# Altium footprint library Test_Stand_Pergam.PcbLib: 34 footprints (part 2 of 3)
Each footprint in its own frame and in the unit in brackets; x right, y up, seen from the top. Pads: shape width x height; smd on the part's side, far side on the other; paste and mask are expansions set on the pad; w line width, h text height; cw(c..) or ccw(c..) is an arc to the next point about the centre after c.
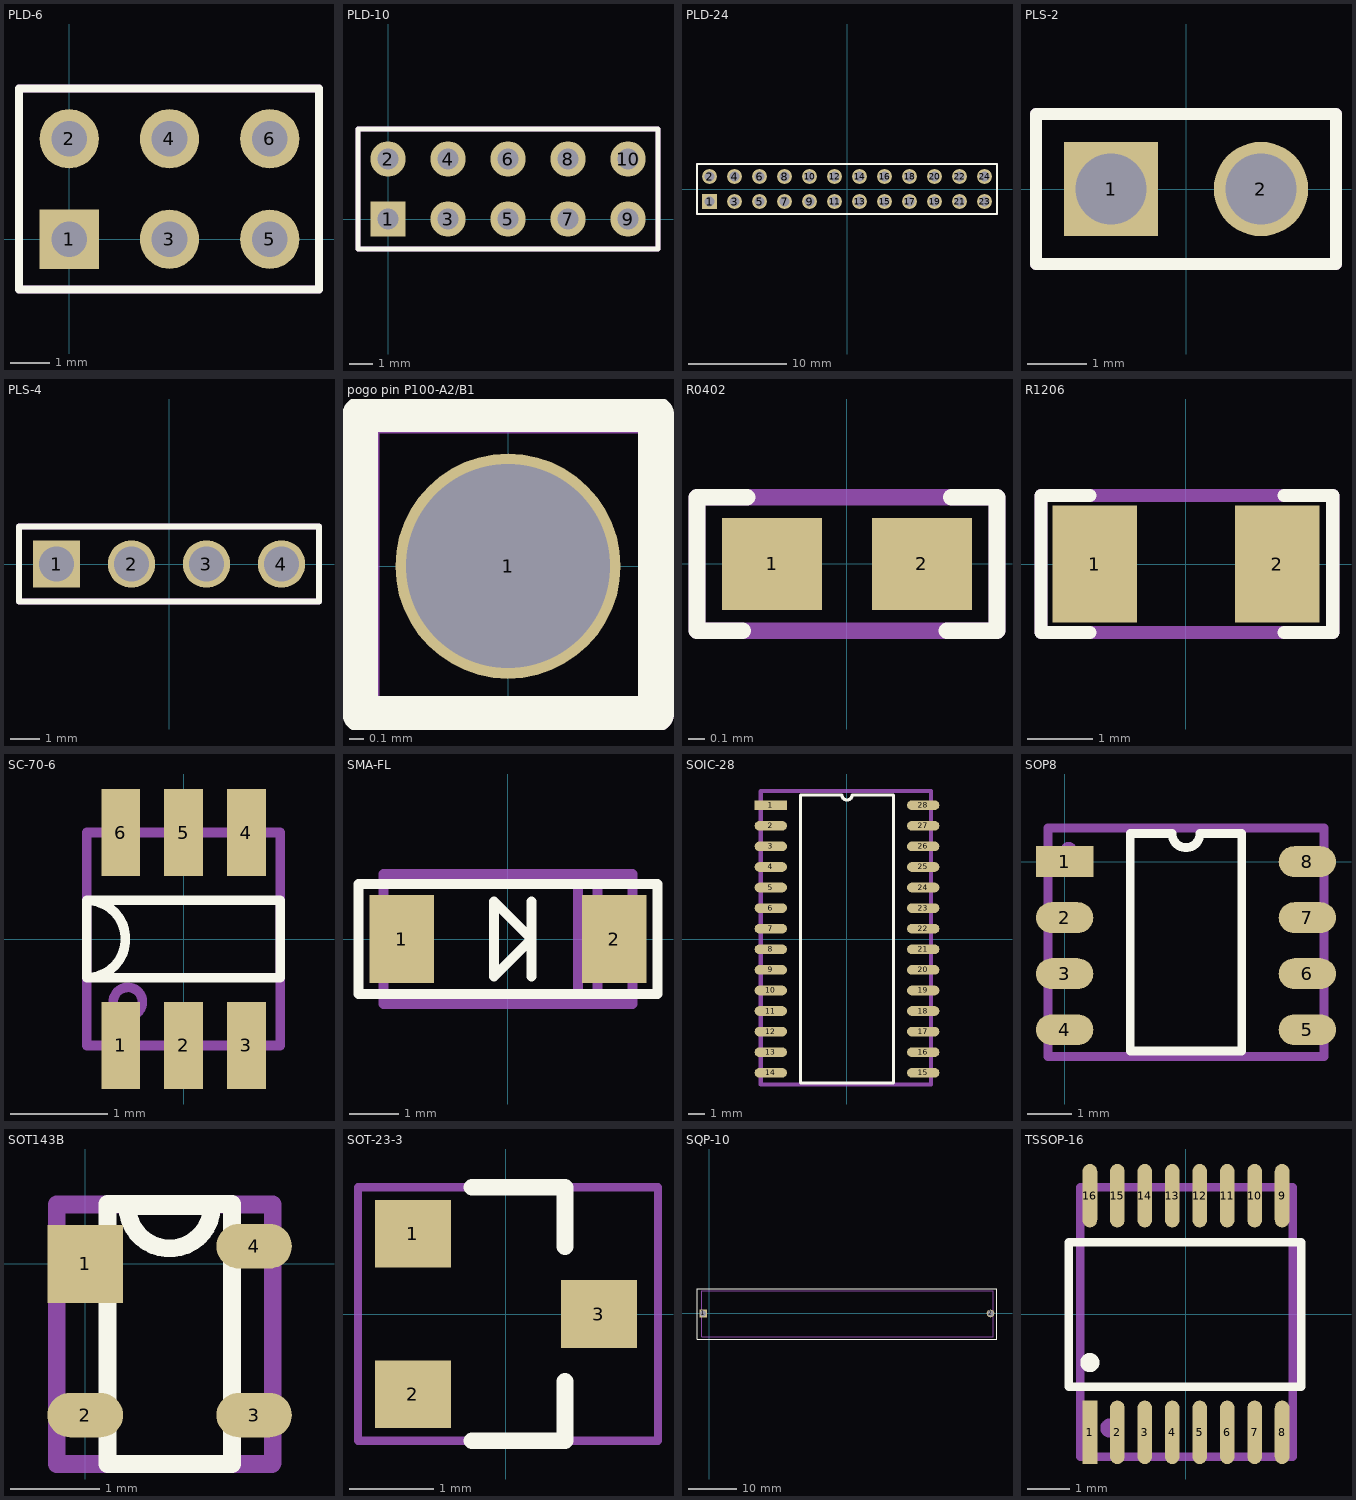
[diagram p1: the footprints below, top view; thin cyan lines are the x and y axes]

## PLD-6 [mm]
height 8.5
pads (6):
  rect 1.5x1.5 hole 0.9: 1(0,0)
  round 1.5 hole 0.9: 2(0,2.54) 3(2.54,0) 4(2.54,2.54) 5(5.08,0) 6(5.08,2.54)
Top Overlay:
  lines w0.2: -1.27,-1.27 -1.27,3.81 6.325,3.81 6.325,-1.27 -1.27,-1.27
Mechanical 29:
  circle w0.254: c0,0 r0.141
  lines w0.2: -1.27,-1.27 -1.27,3.81 6.325,3.81 6.325,-1.27 -1.27,-1.27
  text "'.Designator'" at 1.425,1.175 h0.39
3D body "User Library-2x3 TH Pitch 2_54mm.STEP": height 9.2, standoff -3.5, extent -1.275,-1.275 6.345,3.805

## PLD-10 [mm]
height 8.5
pads (10):
  rect 1.5x1.5 hole 0.9: 1(0,0)
  round 1.5 hole 0.9: 2(0,2.54) 3(2.54,0) 4(2.54,2.54) 5(5.08,0) 6(5.08,2.54) 7(7.62,0) 8(7.62,2.54) 9(10.16,0) 10(10.16,2.54)
Top Overlay:
  lines w0.2: -1.27,-1.27 11.43,-1.27 11.43,3.81 -1.27,3.81 -1.27,-1.27
Mechanical 29:
  circle w0.254: c0,0 r0.141
  lines w0.2: -1.27,-1.27 11.43,-1.27 11.43,3.81 -1.27,3.81 -1.27,-1.27
  text "'.Designator'" at 2,1 h1
3D body "User Library-PLD10.STEP": height 8.54, standoff -3, extent -1.27,-1.265 11.43,3.815

## PLD-24 [mm]
height 8.5
pads (24):
  rect 1.5x1.5 hole 1: 1(-13.97,-1.27)
  round 1.5 hole 1: 2(-13.97,1.27) 3(-11.43,-1.27) 4(-11.43,1.27) 5(-8.89,-1.27) 6(-8.89,1.27) 7(-6.35,-1.27) 8(-6.35,1.27) 9(-3.81,-1.27) 10(-3.81,1.27) 11(-1.27,-1.27) 12(-1.27,1.27) 13(1.27,-1.27) 14(1.27,1.27) 15(3.81,-1.27) 16(3.81,1.27) 17(6.35,-1.27) 18(6.35,1.27) 19(8.89,-1.27) 20(8.89,1.27) 21(11.43,-1.27) 22(11.43,1.27) 23(13.97,-1.27) 24(13.97,1.27)
Top Overlay:
  lines w0.2: -15.24,-2.54 -15.24,2.54 15.24,2.54 15.24,-2.54 -15.24,-2.54
Mechanical 29:
  circle w0.254: c-14.111,-1.27 r0.141
  lines w0.2: -15.24,-2.54 -15.24,2.54 15.24,2.54 15.24,-2.54 -15.24,-2.54
  text "'.Designator'" at -0.25,0 h0.39
3D body "User Library-DS1021-1x6S61.step": height 8.6, standoff -3, extent -15.24,-2.54 0,0
3D body "User Library-DS1021-1x6S61.step": height 8.6, standoff -3, extent 0,-2.54 15.24,0
3D body "User Library-DS1021-1x6S61.step": height 8.6, standoff -3, extent 0,0 15.24,2.54
3D body "User Library-DS1021-1x6S61.step": height 8.6, standoff -3, extent -15.24,0 0,2.54

## PLS-2 [mm]
pads (2):
  rect 1.6x1.6 hole 1.2: 1(-1.27,0)
  round 1.6 hole 1.2: 2(1.27,0)
Top Overlay:
  lines w0.2: -2.54,-1.27 2.54,-1.27 2.54,1.27 -2.54,1.27 -2.54,-1.27
Mechanical 29:
  lines w0.2: -2.54,-1.27 2.54,-1.27 2.54,1.27 -2.54,1.27 -2.54,-1.27
  text "'.Designator'" at -1.905,-0.425 h1
3D body "User Library-PLS2.STEP": height 8.54, standoff -3, extent -2.54,-1.27 2.54,1.27

## PLS-4 [mm]
pads (4):
  rect 1.6x1.6 hole 1.2: 1(-3.81,0)
  round 1.6 hole 1.2: 2(-1.27,0) 3(1.27,0) 4(3.81,0)
Top Overlay:
  lines w0.2: -5.08,-1.27 5.08,-1.27 5.08,1.27 -5.08,1.27 -5.08,-1.27
Mechanical 29:
  lines w0.2: -5.08,-1.27 -5.08,1.27 ; -5.08,-1.27 5.08,-1.27 ; -5.08,-1.27 -5.08,1.27 ; -5.08,-1.27 5.08,-1.27 ; -5.08,1.27 5.08,1.27 ; -5.08,1.27 5.08,1.27 ; 5.08,-1.27 5.08,1.27 ; 5.08,-1.27 5.08,1.27
  text "'.Designator'" at -1.8,-0.5 h1
3D body "User Library-1x4 TH Pitch 2_54mm.STEP": height 9.2, standoff -3.5, extent -5.08,-1.27 5.08,1.27

## pogo pin P100-A2/B1 [mm]
pads (1):
  round 1.6 hole 1.45: 1(0,0)
Top Overlay:
  lines w0.254: -1.05,-1.05 -1.05,1.08 1.05,1.08 1.05,-1.05 -1.05,-1.05
Mechanical 29:
  lines w0.254: -1.04,-1.05 1.05,-1.05 1.05,1.07 -1.04,1.07 -1.04,-1.05
  text "'.Designator'" at 0.1,0.267 h0.5
3D body: height 33.35, standoff 0, extent -0.694,-0.698 0.7,0.699

## R0402 [mm] "Resistor 0402"
height 0.35
pads (2):
  rect 0.6x0.55 smd: 1(-0.45,0) 2(0.45,0)
Top Overlay:
  lines w0.1: -0.625,-0.4 -0.9,-0.4 -0.9,0.4 -0.6,0.4 ; 0.6,-0.4 0.9,-0.4 0.9,0.4 0.625,0.4
Mechanical 29:
  lines w0.1: -0.9,-0.4 0.9,-0.4 0.9,0.4 -0.9,0.4 -0.9,-0.4
  text "'.Designator'" at -0.7,-0.2 h0.39
3D body "User Library-User Library-0402_Res1.STEP": height 0.51, standoff 0, extent -0.73,-0.25 0.73,0.25

## R1206 [mm]
pads (2):
  rect 1.3x1.8 smd: 1(-1.4,0) 2(1.4,0)
Top Overlay:
  lines w0.2: -1.475,-1.05 -2.225,-1.05 -2.225,1.05 -1.475,1.05 ; 1.5,-1.05 2.25,-1.05 2.25,1.05 1.5,1.05
Mechanical 29:
  lines w0.2: -2.225,-1.05 -2.225,1.05 2.25,1.05 2.25,-1.05 -2.225,-1.05
  text "'.Designator'" at -1.8,-0.5 h1
3D body "User Library-User Library-1206_Res1.STEP": height 1.25, standoff 0, extent -2.27,-0.8 2.27,0.8

## SC-70-6 [mm]
pads (6):
  rect 0.4x0.9 smd: 1(-0.65,-1.1) 2(0,-1.1) 3(0.65,-1.1) 4(0.65,1.1) 5(0,1.1) 6(-0.65,1.1)
Top Overlay:
  lines w0.1: -1,-0.4 ccw(c-1,0) -1,0.4 ; -1,-0.4 1,-0.4 1,0.4 -1,0.4 ; -1,-0.4 -1,0.4
Mechanical 29:
  circle w0.1: c-0.575,-0.65 r0.15
  lines w0.1: -1,-1.1 -1,1.1 1,1.1 1,-1.1 -1,-1.1
  text "'.Designator'" at -1.225,-0.15 h0.52
3D body "SC70-6.step": height 0.92, standoff -0.03, extent -1,-1.05 1,1.05

## SMA-FL [mm]
height 1.1
pads (2):
  rect 1.3x1.76 smd: 1(-2.13,0) 2(2.13,0)
Top Overlay:
  lines w0.2: 0.47,-0.75 0.47,0.75 ; -3,-1.1 -3,1.1 3,1.1 3,-1.1 -3,-1.1 ; -0.28,-0.75 -0.28,0.75 0.47,0 -0.28,-0.75
Mechanical 29:
  lines w0.2: 1.4,-1.3 1.4,1.3 ; 1.8,-1.3 1.8,1.3 ; -2.5,-1.3 2.5,-1.3 2.5,1.3 -2.5,1.3 -2.5,-1.3
  text "'.Designator'" at -2.2,0 h0.39
3D body "User Library-sma-fl.STEP": height 1.2, standoff 0, extent -2.55,-1.3 2.55,1.3

## SOIC-28 [mm]
pads (28):
  rect 2x0.6 smd: 1(-4.7,8.255)
  oval 2x0.6 smd: 2(-4.7,6.985) 3(-4.7,5.715) 4(-4.7,4.445) 5(-4.7,3.175) 6(-4.7,1.905) 7(-4.7,0.635) 8(-4.7,-0.635) 9(-4.7,-1.905) 10(-4.7,-3.175) 11(-4.7,-4.445) 12(-4.7,-5.715) 13(-4.7,-6.985) 14(-4.7,-8.255) 15(4.7,-8.255) 16(4.7,-6.985) 17(4.7,-5.715) 18(4.7,-4.445) 19(4.7,-3.175) 20(4.7,-1.905) 21(4.7,-0.635) 22(4.7,0.635) 23(4.7,1.905) 24(4.7,3.175) 25(4.7,4.445) 26(4.7,5.715) 27(4.7,6.985) 28(4.7,8.255)
Top Overlay:
  lines w0.2: -2.865,-8.89 -2.865,8.89 -0.318,8.89 ccw(c0,8.89) 0.318,8.89 2.865,8.89 2.865,-8.89 -2.865,-8.89
Mechanical 29:
  lines w0.254: -5.32,-8.985 -5.32,9.115 -5.31,9.125 5.18,9.125 5.18,8.945 5.18,-8.985 -5.32,-8.985
  text "'.Designator'" at -3.99,-0.237 h0.7
3D body "User Library-SOIC-28-300.STEP": height 2.61, standoff 0.01, extent -5.325,-9.07 5.275,9.03

## SOP8 [mm]
pads (8):
  rect 1.3x0.7 smd: 1(0,0)
  oval 1.3x0.7 smd: 2(0,-1.27) 3(0,-2.54) 4(0,-3.81) 5(5.5,-3.81) 6(5.5,-2.54) 7(5.5,-1.27) 8(5.5,0)
Top Overlay:
  lines w0.2: 1.485,-4.29 1.485,0.635 2.432,0.635 ccw(c2.75,0.635) 3.067,0.635 4.015,0.635 4.015,-4.29 1.485,-4.29
Mechanical 29:
  circle w0.254: c0.09,0.265 r0.054
  lines w0.2: -0.38,-4.415 5.88,-4.415 5.88,0.765 -0.38,0.765 -0.38,-4.415
  text "'.Designator'" at 2.03,-1.647 h0.7
3D body "User Library-sop8_model.STEP": height 1.57, standoff 0.01, extent -0.24,-4.275 5.74,0.625

## SOT143B [mm]
pads (4):
  rect 0.85x0.88 smd: 1(0,0)
  oval 0.85x0.5 smd: 2(0,-1.7) 3(1.9,-1.7) 4(1.9,0.2)
Top Overlay:
  lines w0.2: 0.469,0.65 1.394,0.65 ; 0.475,0.65 ccw(c0.95,0.65) 1.425,0.65 ; 0.25,-2.25 1.65,-2.25 1.65,0.675 0.25,0.675 0.25,-2.25
Mechanical 29:
  lines w0.2: -0.32,-2.25 -0.32,0.67 2.11,0.67 2.11,-2.24 2.1,-2.25 -0.32,-2.25
  text "'.Designator'" at -0.1,-0.997 h0.7
3D body "User Library-sot143.STEP": height 1, standoff 0, extent -0.31,-2.245 2.11,0.675

## SOT-23-3 [mm]
height 1
pads (3):
  rect 0.9x0.8 smd: 1(-1.1,0.95) 2(-1.1,-0.95) 3(1.1,0)
Top Overlay:
  lines w0.2: -0.4,-1.5 0.7,-1.5 0.7,-0.8 ; -0.4,1.5 0.7,1.5 0.7,0.8
Mechanical 29:
  lines w0.1: -1.75,-1.5 -1.75,1.5 1.8,1.5 1.8,-1.5 -1.75,-1.5
  text "'.Designator'" at -0.35,1.275 h0.7
3D body "SOT-23-3.step": height 1.3, standoff 0, extent -1.4,-1.45 1.4,1.45

## SQP-10 [mm]
pads (2):
  rect 1.6x1.6 hole 1.2: 1(-1.27,0)
  round 1.6 hole 1.2: 2(58.725,0)
Top Overlay:
  lines w0.2: -2.54,-5.425 60.075,-5.425 60.075,5.2 -2.54,5.2 -2.54,-5.425
Mechanical 29:
  lines w0.2: -1.575,-4.875 59.25,-4.875 59.25,4.75 -1.575,4.75 -1.575,-4.875
  text "'.Designator'" at -1.905,-0.425 h1
3D body "User Library-SQP10a.step": height 9, standoff -1.5, extent -1.625,-4.825 59.175,4.675

## TSSOP-16 [mm] "16-Lead Thin Shrink Small Outline Package [TSSOP]"
height 1.2
pads (16):
  rect 0.35x1.5 smd: 1(-2.275,-2.8)
  oval 0.35x1.5 smd: 2(-1.625,-2.8) 3(-0.975,-2.8) 4(-0.325,-2.8) 5(0.325,-2.8) 6(0.975,-2.8) 7(1.625,-2.8) 8(2.275,-2.8) 9(2.275,2.8) 10(1.625,2.8) 11(0.975,2.8) 12(0.325,2.8) 13(-0.325,2.8) 14(-0.975,2.8) 15(-1.625,2.8) 16(-2.275,2.8)
Top Overlay:
  circle w0.254: c-2.275,-1.15 r0.1
  lines w0.2: -2.775,-1.725 2.725,-1.725 2.725,1.7 -2.775,1.7 -2.775,-1.725
Mechanical 29:
  circle w0.254: c-1.8,-2.7 r0.1
  lines w0.2: -2.5,-3.375 2.525,-3.375 2.525,3 -2.5,3 -2.5,-3.375
  text "'.Designator'" at 0.5,-1.8 h1
3D body "TSSOP-16-1EP_4.4x5mm_P0.65mm.step": height 1.1, standoff 0, extent -2.475,-3.375 2.525,3.025